# Altium footprint library WR-TBL_Pluggable PCB Header_3.81mm.PcbLib: 198 footprints (part 12 of 13)
Each footprint in its own frame and in the unit in brackets; x right, y up, seen from the top. Pads: shape width x height; smd on the part's side, far side on the other; paste and mask are expansions set on the pad; w line width, h text height; cw(c..) or ccw(c..) is an arc to the next point about the centre after c.
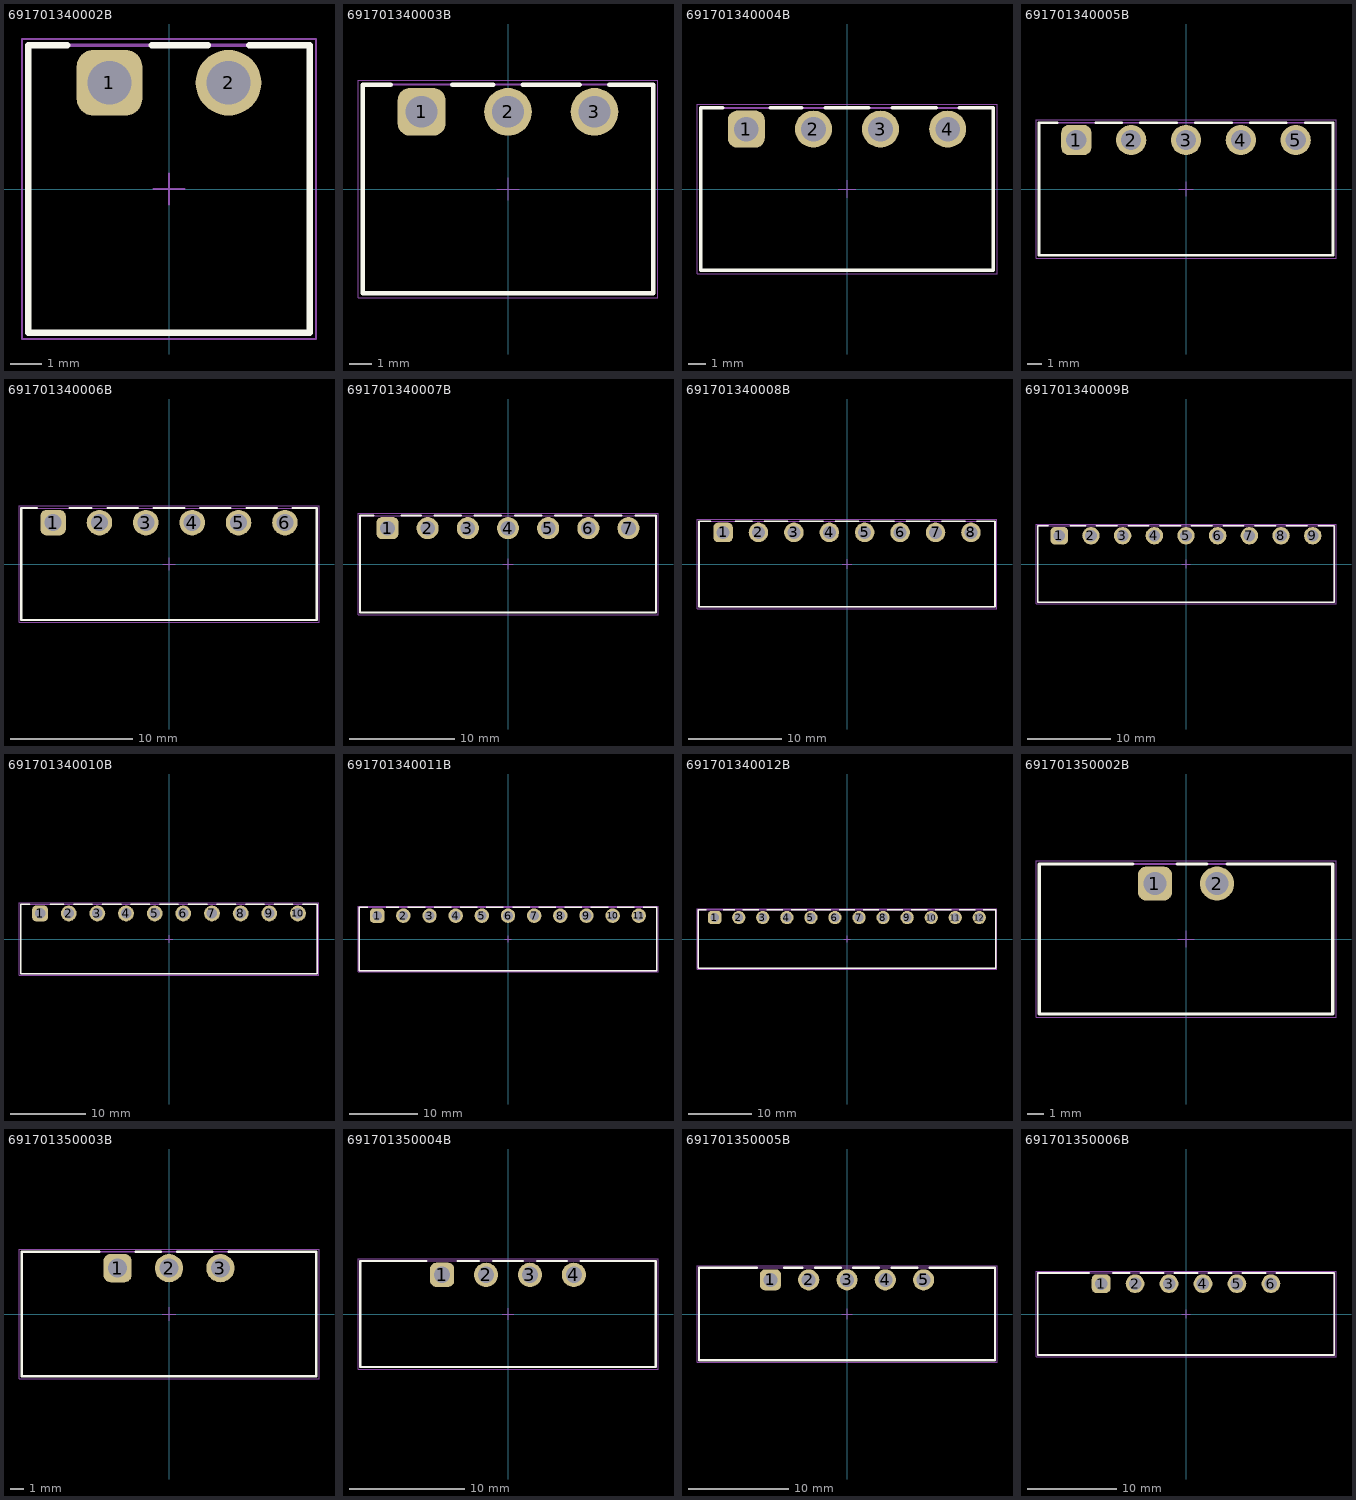
[diagram p11: the footprints below, top view; thin cyan lines are the x and y axes]

## 691701340002B [mm] "Horizontal PCB Header THR Type, pitch 3.81mm, 02p"
height 7.3
pads (2):
  rrect50% 2.1x2.1 hole 1.4: 1(-1.905,3.4)
  round 2.1 hole 1.4: 2(1.905,3.4)
Top Overlay:
  lines w0.2: -3.255,4.6 -4.505,4.6 -4.505,-4.6 4.505,-4.6 4.505,4.6 2.565,4.6 ; -0.555,4.6 1.245,4.6
Top Designator:
  text ".Designator" at -7.498,-0.5 h1.5
Top Component Outline:
  lines w0.1: -4.505,-4.6 -4.505,4.6 4.505,4.6 4.505,-4.6 -4.505,-4.6
Top 3D Body:
  lines w0.1: -4.505,-4.6 4.505,-4.6 4.505,4.6 -4.505,4.6 -4.505,-4.6
Top Courtyard:
  lines w0.05: -4.705,-4.8 4.705,-4.8 4.705,4.8 -4.705,4.8 -4.705,-4.8
Top Component Center:
  lines w0.05: -0.5,0 0.5,0 ; 0,-0.5 0,0.5
3D body "691701340002B.stp": height 7.4, standoff -2.5, extent -4.505,-4.6 4.505,4.6

## 691701340003B [mm] "Horizontal PCB Header THR Type, pitch 3.81mm, 03p"
height 7.3
pads (3):
  rrect50% 2.1x2.1 hole 1.4: 1(-3.81,3.4)
  round 2.1 hole 1.4: 2(0,3.4) 3(3.81,3.4)
Top Overlay:
  lines w0.2: -5.16,4.6 -6.41,4.6 -6.41,-4.6 6.41,-4.6 6.41,4.6 4.47,4.6 ; -2.46,4.6 -0.66,4.6 ; 0.66,4.6 3.15,4.6
Top Designator:
  text ".Designator" at -7.498,-0.5 h1.5
Top Component Outline:
  lines w0.1: -6.41,-4.6 -6.41,4.6 6.41,4.6 6.41,-4.6 -6.41,-4.6
Top 3D Body:
  lines w0.1: -6.41,-4.6 6.41,-4.6 6.41,4.6 -6.41,4.6 -6.41,-4.6
Top Courtyard:
  lines w0.05: -6.61,-4.8 6.61,-4.8 6.61,4.8 -6.61,4.8 -6.61,-4.8
Top Component Center:
  lines w0.05: -0.5,0 0.5,0 ; 0,-0.5 0,0.5
3D body "691701340003B.stp": height 7.4, standoff -2.5, extent -6.41,-4.6 6.41,4.6

## 691701340004B [mm] "Horizontal PCB Header THR Type, pitch 3.81mm, 04p"
height 7.3
pads (4):
  rrect50% 2.1x2.1 hole 1.4: 1(-5.715,3.4)
  round 2.1 hole 1.4: 2(-1.905,3.4) 3(1.905,3.4) 4(5.715,3.4)
Top Overlay:
  lines w0.2: -7.065,4.6 -8.315,4.6 -8.315,-4.6 8.315,-4.6 8.315,4.6 6.375,4.6 ; -4.365,4.6 -2.565,4.6 ; -1.245,4.6 1.245,4.6 ; 2.565,4.6 5.055,4.6
Top Designator:
  text ".Designator" at -7.498,-0.5 h1.5
Top Component Outline:
  lines w0.1: -8.315,-4.6 -8.315,4.6 8.315,4.6 8.315,-4.6 -8.315,-4.6
Top 3D Body:
  lines w0.1: -8.315,-4.6 8.315,-4.6 8.315,4.6 -8.315,4.6 -8.315,-4.6
Top Courtyard:
  lines w0.05: -8.515,-4.8 8.515,-4.8 8.515,4.8 -8.515,4.8 -8.515,-4.8
Top Component Center:
  lines w0.05: -0.5,0 0.5,0 ; 0,-0.5 0,0.5
3D body "691701340004B.stp": height 7.4, standoff -2.5, extent -8.315,-4.6 8.315,4.6

## 691701340005B [mm] "Horizontal PCB Header THR Type, pitch 3.81mm, 05p"
height 7.3
pads (5):
  rrect50% 2.1x2.1 hole 1.4: 1(-7.62,3.4)
  round 2.1 hole 1.4: 2(-3.81,3.4) 3(0,3.4) 4(3.81,3.4) 5(7.62,3.4)
Top Overlay:
  lines w0.2: -8.97,4.6 -10.22,4.6 -10.22,-4.6 10.22,-4.6 10.22,4.6 8.28,4.6 ; -6.27,4.6 -4.47,4.6 ; -3.15,4.6 -0.66,4.6 ; 0.66,4.6 3.15,4.6 ; 4.47,4.6 6.96,4.6
Top Designator:
  text ".Designator" at -7.498,-0.5 h1.5
Top Component Outline:
  lines w0.1: -10.22,-4.6 -10.22,4.6 10.22,4.6 10.22,-4.6 -10.22,-4.6
Top 3D Body:
  lines w0.1: -10.22,-4.6 10.22,-4.6 10.22,4.6 -10.22,4.6 -10.22,-4.6
Top Courtyard:
  lines w0.05: -10.42,-4.8 10.42,-4.8 10.42,4.8 -10.42,4.8 -10.42,-4.8
Top Component Center:
  lines w0.05: -0.5,0 0.5,0 ; 0,-0.5 0,0.5
3D body "691701340005B.stp": height 7.4, standoff -2.5, extent -10.22,-4.6 10.22,4.6

## 691701340006B [mm] "Horizontal PCB Header THR Type, pitch 3.81mm, 06p"
height 7.3
pads (6):
  rrect50% 2.1x2.1 hole 1.4: 1(-9.525,3.4)
  round 2.1 hole 1.4: 2(-5.715,3.4) 3(-1.905,3.4) 4(1.905,3.4) 5(5.715,3.4) 6(9.525,3.4)
Top Overlay:
  lines w0.2: -10.875,4.6 -12.125,4.6 -12.125,-4.6 12.125,-4.6 12.125,4.6 10.185,4.6 ; -8.175,4.6 -6.375,4.6 ; -5.055,4.6 -2.565,4.6 ; -1.245,4.6 1.245,4.6 ; 2.565,4.6 5.055,4.6 ; 6.375,4.6 8.865,4.6
Top Designator:
  text ".Designator" at -7.498,-0.5 h1.5
Top Component Outline:
  lines w0.1: -12.125,-4.6 12.125,-4.6 12.125,4.6 -12.125,4.6 -12.125,-4.6
Top 3D Body:
  lines w0.1: -12.125,-4.6 -12.125,4.6 12.125,4.6 12.125,-4.6 -12.125,-4.6
Top Courtyard:
  lines w0.05: -12.325,-4.8 -12.325,4.8 12.325,4.8 12.325,-4.8 -12.325,-4.8
Top Component Center:
  lines w0.05: -0.5,0 0.5,0 ; 0,-0.5 0,0.5
3D body "691701340006B.stp": height 7.4, standoff -2.5, extent -12.125,-4.6 12.125,4.6

## 691701340007B [mm] "Horizontal PCB Header THR Type, pitch 3.81mm, 07p"
height 7.3
pads (7):
  rrect50% 2.1x2.1 hole 1.4: 1(-11.43,3.4)
  round 2.1 hole 1.4: 2(-7.62,3.4) 3(-3.81,3.4) 4(0,3.4) 5(3.81,3.4) 6(7.62,3.4) 7(11.43,3.4)
Top Overlay:
  lines w0.2: -12.78,4.6 -14.03,4.6 -14.03,-4.6 14.03,-4.6 14.03,4.6 12.09,4.6 ; -10.08,4.6 -8.28,4.6 ; -6.96,4.6 -4.47,4.6 ; -3.15,4.6 -0.66,4.6 ; 0.66,4.6 3.15,4.6 ; 4.47,4.6 6.96,4.6 ; 8.28,4.6 10.77,4.6
Top Designator:
  text ".Designator" at -7.498,-0.5 h1.5
Top Component Outline:
  lines w0.1: -14.03,-4.6 -14.03,4.6 14.03,4.6 14.03,-4.6 -14.03,-4.6
Top 3D Body:
  lines w0.1: -14.03,-4.6 14.03,-4.6 14.03,4.6 -14.03,4.6 -14.03,-4.6
Top Courtyard:
  lines w0.05: -14.23,-4.8 14.23,-4.8 14.23,4.8 -14.23,4.8 -14.23,-4.8
Top Component Center:
  lines w0.05: -0.5,0 0.5,0 ; 0,-0.5 0,0.5
3D body "691701340007B.stp": height 7.4, standoff -2.5, extent -14.03,-4.6 14.03,4.6

## 691701340008B [mm] "Horizontal PCB Header THR Type, pitch 3.81mm, 08p"
height 7.3
pads (8):
  rrect50% 2.1x2.1 hole 1.4: 1(-13.335,3.4)
  round 2.1 hole 1.4: 2(-9.525,3.4) 3(-5.715,3.4) 4(-1.905,3.4) 5(1.905,3.4) 6(5.715,3.4) 7(9.525,3.4) 8(13.335,3.4)
Top Overlay:
  lines w0.2: -14.685,4.6 -15.935,4.6 -15.935,-4.6 15.935,-4.6 15.935,4.6 13.995,4.6 ; -11.985,4.6 -10.185,4.6 ; -8.865,4.6 -6.375,4.6 ; -5.055,4.6 -2.565,4.6 ; -1.245,4.6 1.245,4.6 ; 2.565,4.6 5.055,4.6 ; 6.375,4.6 8.865,4.6 ; 10.185,4.6 12.675,4.6
Top Designator:
  text ".Designator" at -7.498,-0.5 h1.5
Top Component Outline:
  lines w0.1: -15.935,-4.6 15.935,-4.6 15.935,4.6 -15.935,4.6 -15.935,-4.6
Top 3D Body:
  lines w0.1: -15.935,-4.6 -15.935,4.6 15.935,4.6 15.935,-4.6 -15.935,-4.6
Top Courtyard:
  lines w0.05: -16.135,-4.8 -16.135,4.8 16.135,4.8 16.135,-4.8 -16.135,-4.8
Top Component Center:
  lines w0.05: -0.5,0 0.5,0 ; 0,-0.5 0,0.5
3D body "691701340008B.stp": height 7.4, standoff -2.5, extent -15.935,-4.6 15.935,4.6

## 691701340009B [mm] "Horizontal PCB Header THR Type, pitch 3.81mm, 09p"
height 7.3
pads (9):
  rrect50% 2.1x2.1 hole 1.4: 1(-15.24,3.4)
  round 2.1 hole 1.4: 2(-11.43,3.4) 3(-7.62,3.4) 4(-3.81,3.4) 5(0,3.4) 6(3.81,3.4) 7(7.62,3.4) 8(11.43,3.4) 9(15.24,3.4)
Top Overlay:
  lines w0.2: -16.59,4.6 -17.84,4.6 -17.84,-4.6 17.84,-4.6 17.84,4.6 15.9,4.6 ; -13.89,4.6 -12.09,4.6 ; -10.77,4.6 -8.28,4.6 ; -6.96,4.6 -4.47,4.6 ; -3.15,4.6 -0.66,4.6 ; 0.66,4.6 3.15,4.6 ; 4.47,4.6 6.96,4.6 ; 8.28,4.6 10.77,4.6 ; 12.09,4.6 14.58,4.6
Top Designator:
  text ".Designator" at -7.498,-0.5 h1.5
Top Component Outline:
  lines w0.1: -17.84,-4.6 -17.84,4.6 17.84,4.6 17.84,-4.6 -17.84,-4.6
Top 3D Body:
  lines w0.1: -17.84,-4.6 17.84,-4.6 17.84,4.6 -17.84,4.6 -17.84,-4.6
Top Courtyard:
  lines w0.05: -18.04,-4.8 18.04,-4.8 18.04,4.8 -18.04,4.8 -18.04,-4.8
Top Component Center:
  lines w0.05: -0.5,0 0.5,0 ; 0,-0.5 0,0.5
3D body "691701340009B.stp": height 7.4, standoff -2.5, extent -17.84,-4.6 17.84,4.6

## 691701340010B [mm] "Horizontal PCB Header THR Type, pitch 3.81mm, 10p"
height 7.3
pads (10):
  rrect50% 2.1x2.1 hole 1.4: 1(-17.145,3.4)
  round 2.1 hole 1.4: 2(-13.335,3.4) 3(-9.525,3.4) 4(-5.715,3.4) 5(-1.905,3.4) 6(1.905,3.4) 7(5.715,3.4) 8(9.525,3.4) 9(13.335,3.4) 10(17.145,3.4)
Top Overlay:
  lines w0.2: -18.495,4.6 -19.745,4.6 -19.745,-4.6 19.745,-4.6 19.745,4.6 17.805,4.6 ; -15.795,4.6 -13.995,4.6 ; -12.675,4.6 -10.185,4.6 ; -8.865,4.6 -6.375,4.6 ; -5.055,4.6 -2.565,4.6 ; -1.245,4.6 1.245,4.6 ; 2.565,4.6 5.055,4.6 ; 6.375,4.6 8.865,4.6 ; 10.185,4.6 12.675,4.6 ; 13.995,4.6 16.485,4.6
Top Designator:
  text ".Designator" at -7.498,-0.5 h1.5
Top Component Outline:
  lines w0.1: -19.745,-4.6 19.745,-4.6 19.745,4.6 -19.745,4.6 -19.745,-4.6
Top 3D Body:
  lines w0.1: -19.745,-4.6 -19.745,4.6 19.745,4.6 19.745,-4.6 -19.745,-4.6
Top Courtyard:
  lines w0.05: -19.945,-4.8 -19.945,4.8 19.945,4.8 19.945,-4.8 -19.945,-4.8
Top Component Center:
  lines w0.05: -0.5,0 0.5,0 ; 0,-0.5 0,0.5
3D body "691701340010B.stp": height 7.4, standoff -2.5, extent -19.745,-4.6 19.745,4.6

## 691701340011B [mm] "Horizontal PCB Header THR Type, pitch 3.81mm, 11p"
height 7.3
pads (11):
  rrect50% 2.1x2.1 hole 1.4: 1(-19.05,3.4)
  round 2.1 hole 1.4: 2(-15.24,3.4) 3(-11.43,3.4) 4(-7.62,3.4) 5(-3.81,3.4) 6(0,3.4) 7(3.81,3.4) 8(7.62,3.4) 9(11.43,3.4) 10(15.24,3.4) 11(19.05,3.4)
Top Overlay:
  lines w0.2: -20.4,4.6 -21.65,4.6 -21.65,-4.6 21.65,-4.6 21.65,4.6 19.71,4.6 ; -17.7,4.6 -15.9,4.6 ; -14.58,4.6 -12.09,4.6 ; -10.77,4.6 -8.28,4.6 ; -6.96,4.6 -4.47,4.6 ; -3.15,4.6 -0.66,4.6 ; 0.66,4.6 3.15,4.6 ; 4.47,4.6 6.96,4.6 ; 8.28,4.6 10.77,4.6 ; 12.09,4.6 14.58,4.6 ; 15.9,4.6 18.39,4.6
Top Designator:
  text ".Designator" at -7.498,-0.5 h1.5
Top Component Outline:
  lines w0.1: -21.65,-4.6 -21.65,4.6 21.65,4.6 21.65,-4.6 -21.65,-4.6
Top 3D Body:
  lines w0.1: -21.65,-4.6 21.65,-4.6 21.65,4.6 -21.65,4.6 -21.65,-4.6
Top Courtyard:
  lines w0.05: -21.85,-4.8 21.85,-4.8 21.85,4.8 -21.85,4.8 -21.85,-4.8
Top Component Center:
  lines w0.05: -0.5,0 0.5,0 ; 0,-0.5 0,0.5
3D body "691701340011B.stp": height 7.4, standoff -2.5, extent -21.65,-4.6 21.65,4.6

## 691701340012B [mm] "Horizontal PCB Header THR Type, pitch 3.81mm, 12p"
height 7.3
pads (12):
  rrect50% 2.1x2.1 hole 1.4: 1(-20.955,3.4)
  round 2.1 hole 1.4: 2(-17.145,3.4) 3(-13.335,3.4) 4(-9.525,3.4) 5(-5.715,3.4) 6(-1.905,3.4) 7(1.905,3.4) 8(5.715,3.4) 9(9.525,3.4) 10(13.335,3.4) 11(17.145,3.4) 12(20.955,3.4)
Top Overlay:
  lines w0.2: -22.305,4.6 -23.555,4.6 -23.555,-4.6 23.555,-4.6 23.555,4.6 21.615,4.6 ; -19.605,4.6 -17.805,4.6 ; -16.485,4.6 -13.995,4.6 ; -12.675,4.6 -10.185,4.6 ; -8.865,4.6 -6.375,4.6 ; -5.055,4.6 -2.565,4.6 ; -1.245,4.6 1.245,4.6 ; 2.565,4.6 5.055,4.6 ; 6.375,4.6 8.865,4.6 ; 10.185,4.6 12.675,4.6 ; 13.995,4.6 16.485,4.6 ; 17.805,4.6 20.295,4.6
Top Designator:
  text ".Designator" at -7.498,-0.5 h1.5
Top Component Outline:
  lines w0.1: -23.555,-4.6 23.555,-4.6 23.555,4.6 -23.555,4.6 -23.555,-4.6
Top 3D Body:
  lines w0.1: -23.555,-4.6 -23.555,4.6 23.555,4.6 23.555,-4.6 -23.555,-4.6
Top Courtyard:
  lines w0.05: -23.755,-4.8 -23.755,4.8 23.755,4.8 23.755,-4.8 -23.755,-4.8
Top Component Center:
  lines w0.05: -0.5,0 0.5,0 ; 0,-0.5 0,0.5
3D body "691701340012B.stp": height 7.4, standoff -2.5, extent -23.555,-4.6 23.555,4.6

## 691701350002B [mm] "Horizontal PCB Header THR Type with Flanges, pitch 3.81mm, 02p"
height 7.3
pads (2):
  rrect50% 2.1x2.1 hole 1.4: 1(-1.905,3.4)
  round 2.1 hole 1.4: 2(1.905,3.4)
Top Overlay:
  lines w0.2: -3.255,4.6 -9.005,4.6 -9.005,-4.6 9.005,-4.6 9.005,4.6 2.515,4.6 ; -0.555,4.6 1.295,4.6
Top Designator:
  text ".Designator" at -7.498,-0.5 h1.5
Top Component Outline:
  lines w0.1: -9.005,-4.6 9.005,-4.6 9.005,4.6 -9.005,4.6 -9.005,-4.6
Top 3D Body:
  lines w0.1: -9.005,-4.6 -9.005,4.6 9.005,4.6 9.005,-4.6 -9.005,-4.6
Top Courtyard:
  lines w0.05: -9.205,-4.8 9.205,-4.8 9.205,4.8 -9.205,4.8 -9.205,-4.8
Top Component Center:
  lines w0.05: -0.5,0 0.5,0 ; 0,-0.5 0,0.5
3D body "691701350002B.stp": height 7.35, standoff -2.55, extent -9.005,-4.6 9.005,4.6

## 691701350003B [mm] "Horizontal PCB Header THR Type with Flanges, pitch 3.81mm, 03p"
height 7.3
pads (3):
  rrect50% 2.1x2.1 hole 1.4: 1(-3.81,3.4)
  round 2.1 hole 1.4: 2(0,3.4) 3(3.81,3.4)
Top Overlay:
  lines w0.2: -5.16,4.6 -10.91,4.6 -10.91,-4.6 10.91,-4.6 10.91,4.6 4.42,4.6 ; -2.46,4.6 -0.61,4.6 ; 0.61,4.6 3.2,4.6
Top Designator:
  text ".Designator" at -7.498,-0.5 h1.5
Top Component Outline:
  lines w0.1: -10.91,-4.6 10.91,-4.6 10.91,4.6 -10.91,4.6 -10.91,-4.6
Top 3D Body:
  lines w0.1: -10.91,-4.6 -10.91,4.6 10.91,4.6 10.91,-4.6 -10.91,-4.6
Top Courtyard:
  lines w0.05: -11.11,-4.8 11.11,-4.8 11.11,4.8 -11.11,4.8 -11.11,-4.8
Top Component Center:
  lines w0.05: -0.5,0 0.5,0 ; 0,-0.5 0,0.5
3D body "691701350003B.stp": height 7.35, standoff -2.55, extent -10.91,-4.6 10.91,4.6

## 691701350004B [mm] "Horizontal PCB Header THR Type with Flanges, pitch 3.81mm, 04p"
height 7.3
pads (4):
  rrect50% 2.1x2.1 hole 1.4: 1(-5.715,3.4)
  round 2.1 hole 1.4: 2(-1.905,3.4) 3(1.905,3.4) 4(5.715,3.4)
Top Overlay:
  lines w0.2: -7.065,4.6 -12.815,4.6 -12.815,-4.6 12.815,-4.6 12.815,4.6 6.325,4.6 ; -4.365,4.6 -2.515,4.6 ; -1.295,4.6 1.295,4.6 ; 2.515,4.6 5.105,4.6
Top Designator:
  text ".Designator" at -7.498,-0.5 h1.5
Top Component Outline:
  lines w0.1: -12.815,-4.6 -12.815,4.6 12.815,4.6 12.815,-4.6 -12.815,-4.6
Top 3D Body:
  lines w0.1: -12.815,-4.6 12.815,-4.6 12.815,4.6 -12.815,4.6 -12.815,-4.6
Top Courtyard:
  lines w0.05: -13.015,-4.8 -13.015,4.8 13.015,4.8 13.015,-4.8 -13.015,-4.8
Top Component Center:
  lines w0.05: -0.5,0 0.5,0 ; 0,-0.5 0,0.5
3D body "691701350004B.stp": height 7.35, standoff -2.55, extent -12.815,-4.6 12.815,4.6

## 691701350005B [mm] "Horizontal PCB Header THR Type with Flanges, pitch 3.81mm, 05p"
height 7.3
pads (5):
  rrect50% 2.1x2.1 hole 1.4: 1(-7.62,3.4)
  round 2.1 hole 1.4: 2(-3.81,3.4) 3(0,3.4) 4(3.81,3.4) 5(7.62,3.4)
Top Overlay:
  lines w0.2: -8.97,4.6 -14.72,4.6 -14.72,-4.6 14.72,-4.6 14.72,4.6 8.23,4.6 ; -6.27,4.6 -4.42,4.6 ; -3.2,4.6 -0.61,4.6 ; 0.61,4.6 3.2,4.6 ; 4.42,4.6 7.01,4.6
Top Designator:
  text ".Designator" at -7.498,-0.5 h1.5
Top Component Outline:
  lines w0.1: -14.72,-4.6 -14.72,4.6 14.72,4.6 14.72,-4.6 -14.72,-4.6
Top 3D Body:
  lines w0.1: -14.72,-4.6 14.72,-4.6 14.72,4.6 -14.72,4.6 -14.72,-4.6
Top Courtyard:
  lines w0.05: -14.92,-4.8 -14.92,4.8 14.92,4.8 14.92,-4.8 -14.92,-4.8
Top Component Center:
  lines w0.05: -0.5,0 0.5,0 ; 0,-0.5 0,0.5
3D body "691701350005B.stp": height 7.35, standoff -2.55, extent -14.72,-4.6 14.72,4.6

## 691701350006B [mm] "Horizontal PCB Header THR Type with Flanges, pitch 3.81mm, 06p"
height 7.3
pads (6):
  rrect50% 2.1x2.1 hole 1.4: 1(-9.525,3.4)
  round 2.1 hole 1.4: 2(-5.715,3.4) 3(-1.905,3.4) 4(1.905,3.4) 5(5.715,3.4) 6(9.525,3.4)
Top Overlay:
  lines w0.2: -10.875,4.6 -16.625,4.6 -16.625,-4.6 16.625,-4.6 16.625,4.6 10.135,4.6 ; -8.175,4.6 -6.325,4.6 ; -5.105,4.6 -2.515,4.6 ; -1.295,4.6 1.295,4.6 ; 2.515,4.6 5.105,4.6 ; 6.325,4.6 8.915,4.6
Top Designator:
  text ".Designator" at -7.498,-0.5 h1.5
Top Component Outline:
  lines w0.1: -16.625,-4.6 16.625,-4.6 16.625,4.6 -16.625,4.6 -16.625,-4.6
Top 3D Body:
  lines w0.1: -16.625,-4.6 -16.625,4.6 16.625,4.6 16.625,-4.6 -16.625,-4.6
Top Courtyard:
  lines w0.05: -16.825,-4.8 16.825,-4.8 16.825,4.8 -16.825,4.8 -16.825,-4.8
Top Component Center:
  lines w0.05: -0.5,0 0.5,0 ; 0,-0.5 0,0.5
3D body "691701350006B.stp": height 7.35, standoff -2.55, extent -16.625,-4.6 16.625,4.6